# Altium footprint library WR-TBL_Wire Protector.PcbLib: 120 footprints (part 1 of 8)
Each footprint in its own frame and in the unit in brackets; x right, y up, seen from the top. Pads: shape width x height; smd on the part's side, far side on the other; paste and mask are expansions set on the pad; w line width, h text height; cw(c..) or ccw(c..) is an arc to the next point about the centre after c.
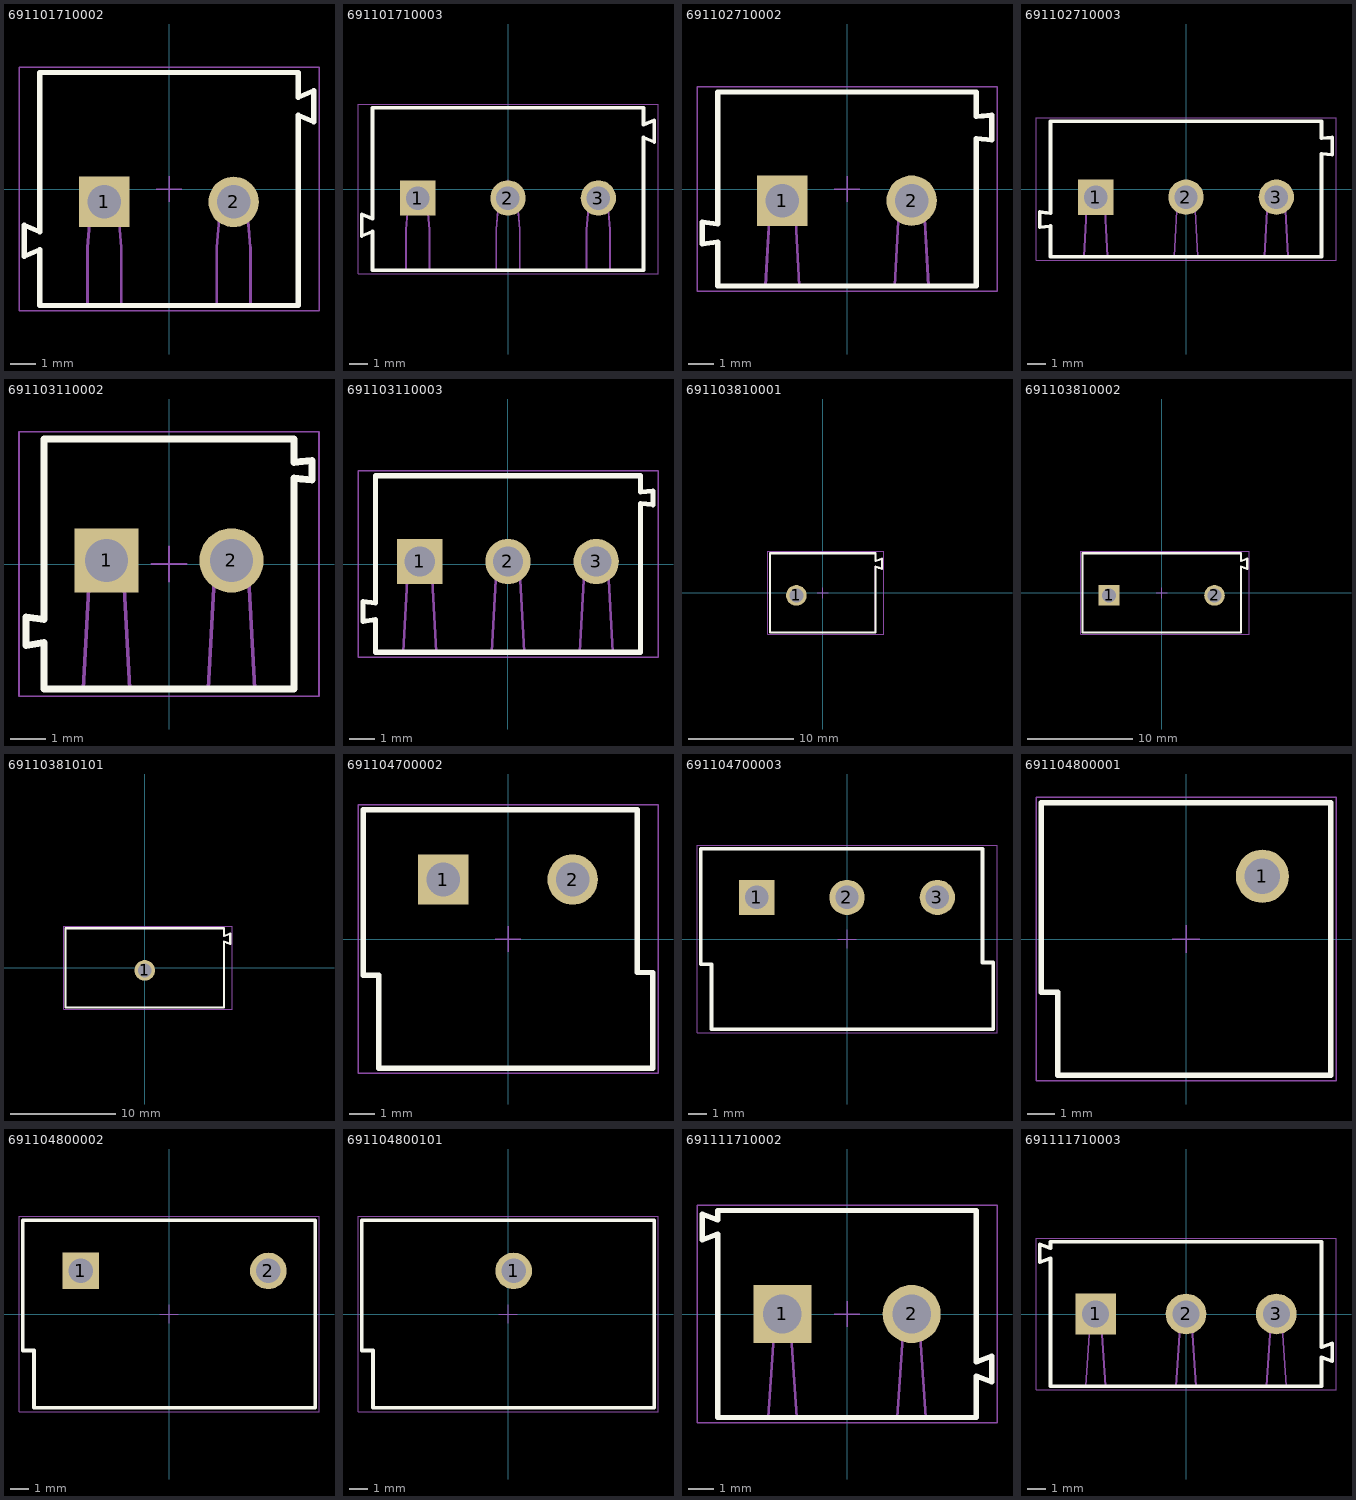
[diagram p0: the footprints below, top view; thin cyan lines are the x and y axes]

## 691101710002 [mm] "5,00mm - modular - blue - Horizontal entry with pressure clamp - 12,6mm height - 02p"
height 12.6
pads (2):
  rect 1.95x1.95 hole 1.3: 1(-2.5,-0.5)
  round 1.95 hole 1.3: 2(2.5,-0.5)
Top Overlay:
  lines w0.2: -5,-2.35 -5.6,-2.6 -5.6,-1.4 -5,-1.65 -5,4.5 5,4.5 5,3.55 5.6,3.8 5.6,2.6 5,2.85 5,-4.5 -5,-4.5 -5,-2.35
Mechanical 13:
  lines w0.1: -5,-2.35 -5.6,-2.6 -5.6,-1.4 -5,-1.65 -5,4.5 5,4.5 5,3.55 5.6,3.8 5.6,2.6 5,2.85 5,-4.5 -5,-4.5 -5,-2.35 ; -3.15,-4.5 -3.15,-2.25 -2.996,-0.457 ; -3,-0.5 cw(c-2.5,-0.5) -2,-0.5 ; -2.004,-0.457 -1.85,-2.25 -1.85,-4.5 ; 1.85,-4.5 1.85,-2.25 2.004,-0.457 ; 2,-0.5 cw(c2.5,-0.5) 3,-0.5 ; 2.996,-0.457 3.15,-2.25 3.15,-4.5
Mechanical 15:
  lines w0.05: -0.5,0 0.5,0 ; 0,-0.5 0,0.5 ; -5.8,-4.7 -5.8,4.7 5.8,4.7 5.8,-4.7 -5.8,-4.7
3D body "691101710002.stp": height 12.65, standoff -3.75, extent -5.6,-4.5 5.6,4.5

## 691101710003 [mm] "5,00mm - modular - blue - Horizontal entry with pressure clamp - 12,6mm height - 03p"
height 12.6
pads (3):
  rect 1.95x1.95 hole 1.3: 1(-5,-0.5)
  round 1.95 hole 1.3: 2(0,-0.5) 3(5,-0.5)
Top Overlay:
  lines w0.2: -7.5,-2.35 -8.1,-2.6 -8.1,-1.4 -7.5,-1.65 -7.5,4.5 7.5,4.5 7.5,3.55 8.1,3.8 8.1,2.6 7.5,2.85 7.5,-4.5 -7.5,-4.5 -7.5,-2.35
Mechanical 13:
  lines w0.1: -7.5,-2.35 -8.1,-2.6 -8.1,-1.4 -7.5,-1.65 -7.5,4.5 7.5,4.5 7.5,3.55 8.1,3.8 8.1,2.6 7.5,2.85 7.5,-4.5 -7.5,-4.5 -7.5,-2.35 ; -5.65,-4.5 -5.65,-2.25 -5.496,-0.457 ; -5.5,-0.5 cw(c-5,-0.5) -4.5,-0.5 ; -4.504,-0.457 -4.35,-2.25 -4.35,-4.5 ; -0.65,-4.5 -0.65,-2.25 -0.496,-0.457 ; -0.5,-0.5 cw(c0,-0.5) 0.5,-0.5 ; 0.496,-0.457 0.65,-2.25 0.65,-4.5 ; 4.35,-4.5 4.35,-2.25 4.503,-0.457 ; 4.5,-0.5 cw(c5,-0.5) 5.5,-0.5 ; 5.496,-0.457 5.65,-2.25 5.65,-4.5
Mechanical 15:
  lines w0.05: -0.5,0 0.5,0 ; 0,-0.5 0,0.5 ; -8.3,-4.7 8.3,-4.7 8.3,4.7 -8.3,4.7 -8.3,-4.7
3D body "691101710003.stp": height 12.65, standoff -3.75, extent -8.1,-4.5 8.1,4.5

## 691102710002 [mm] "5,00mm - modular - blue - Horizontal entry with pressure clamp - 9,9 mm height - 02p"
height 9.9
pads (2):
  rect 1.95x1.95 hole 1.3: 1(-2.5,-0.45)
  round 1.95 hole 1.3: 2(2.5,-0.45)
Top Overlay:
  lines w0.2: -5.6,-2.125 -5,-2.05 -5,-3.75 5,-3.75 5,1.95 5.6,1.9 5.6,2.85 5,2.8 5,3.75 -5,3.75 -5,-1.35 -5.6,-1.275 -5.6,-2.125
Mechanical 13:
  lines w0.1: -3.15,-3.75 -2.955,-0.15 ; -2.95,-0.15 cw(c-2.5,-0.15) -2.05,-0.15 ; -2.045,-0.15 -1.85,-3.75 ; 1.85,-3.75 2.045,-0.15 ; 2.05,-0.15 cw(c2.5,-0.15) 2.95,-0.15 ; 2.955,-0.15 3.15,-3.75 ; -5.6,-2.125 -5.6,-1.275 -5,-1.35 -5,3.75 5,3.75 5,2.8 5.6,2.85 5.6,1.9 5,1.95 5,-3.75 -5,-3.75 -5,-2.05 -5.6,-2.125
Mechanical 15:
  lines w0.05: -0.5,0 0.5,0 ; 0,-0.5 0,0.5 ; -5.8,-3.95 5.8,-3.95 5.8,3.95 -5.8,3.95 -5.8,-3.95
3D body "691102710002.stp": height 9.96, standoff -3.44, extent -5.6,-3.75 5.6,3.75

## 691102710003 [mm] "5,00mm - modular - blue - Horizontal entry with pressure clamp - 9,9 mm height - 03p"
height 9.9
pads (3):
  rect 1.95x1.95 hole 1.3: 1(-5,-0.45)
  round 1.95 hole 1.3: 2(0,-0.45) 3(5,-0.45)
Top Overlay:
  lines w0.2: -8.1,-2.125 -8.1,-1.275 -7.5,-1.35 -7.5,3.75 7.5,3.75 7.5,2.8 8.1,2.85 8.1,1.9 7.5,1.95 7.5,-3.75 -7.5,-3.75 -7.5,-2.05 -8.1,-2.125
Mechanical 13:
  lines w0.1: -5.65,-3.75 -5.455,-0.15 ; -5.45,-0.15 cw(c-5,-0.15) -4.55,-0.15 ; -4.545,-0.15 -4.35,-3.75 ; -0.65,-3.75 -0.455,-0.15 ; -0.45,-0.15 cw(c0,-0.15) 0.45,-0.15 ; 0.455,-0.15 0.65,-3.75 ; 4.35,-3.75 4.545,-0.15 ; 4.55,-0.15 cw(c5,-0.15) 5.45,-0.15 ; 5.455,-0.15 5.65,-3.75 ; -8.1,-2.125 -7.5,-2.05 -7.5,-3.75 7.5,-3.75 7.5,1.95 8.1,1.9 8.1,2.85 7.5,2.8 7.5,3.75 -7.5,3.75 -7.5,-1.35 -8.1,-1.275 -8.1,-2.125
Mechanical 15:
  lines w0.05: -0.5,0 0.5,0 ; 0,-0.5 0,0.5 ; -8.3,-3.95 -8.3,3.95 8.3,3.95 8.3,-3.95 -8.3,-3.95
3D body "691102710003.stp": height 9.96, standoff -3.44, extent -8.1,-3.75 8.1,3.75

## 691103110002 [mm] "3,50mm - modular - blue - Horizontal wire entry - Pressure clamp - 8,4mm height - 02p"
height 8.4
pads (2):
  rect 1.8x1.8 hole 1.2: 1(-1.75,0.1)
  round 1.8 hole 1.2: 2(1.75,0.1)
Top Overlay:
  lines w0.2: -3.5,-1.55 -3.5,3.5 3.5,3.5 3.5,2.85 4,2.899 4,2.35 ; -3.499,-1.55 -4,-1.48 -4,-2.278 -3.5,-2.2 -3.5,-3.5 3.5,-3.5 3.5,2.4 4,2.351
Mechanical 13:
  lines w0.1: -3.5,-1.55 -3.5,3.5 3.5,3.5 3.5,2.85 4,2.899 4,2.35 ; -3.499,-1.55 -4,-1.48 -4,-2.278 -3.5,-2.2 -3.5,-3.5 3.5,-3.5 3.5,2.4 4,2.351 ; -2.4,-3.5 -2.205,0.1 ; -2.2,0.1 cw(c-1.75,0.1) -1.3,0.1 ; -1.295,0.1 -1.1,-3.5 ; 1.1,-3.5 1.295,0.1 ; 1.3,0.1 cw(c1.75,0.1) 2.2,0.1 ; 2.205,0.1 2.4,-3.5
Mechanical 15:
  lines w0.05: -0.5,0 0.5,0 ; 0,-0.5 0,0.5 ; -4.2,-3.7 -4.2,3.7 4.2,3.7 4.2,-3.7 -4.2,-3.7
3D body "691103110002.stp": height 8.45, standoff -3.75, extent -4,-3.5 4,3.5

## 691103110003 [mm] "3,50mm - modular - blue - Horizontal wire entry - Pressure clamp - 8,4mm height - 03p"
height 8.4
pads (3):
  rect 1.8x1.8 hole 1.2: 1(-3.5,0.1)
  round 1.8 hole 1.2: 2(0,0.1) 3(3.5,0.1)
Top Overlay:
  lines w0.2: -5.25,-1.55 -5.25,3.5 5.25,3.5 5.25,2.85 5.75,2.899 5.75,2.35 ; -5.249,-1.55 -5.75,-1.48 -5.75,-2.278 -5.25,-2.2 -5.25,-3.5 5.25,-3.5 5.25,2.4 5.75,2.351
Mechanical 13:
  lines w0.1: -5.25,-1.55 -5.25,3.5 5.25,3.5 5.25,2.85 5.75,2.899 5.75,2.35 ; -5.249,-1.55 -5.75,-1.48 -5.75,-2.278 -5.25,-2.2 -5.25,-3.5 5.25,-3.5 5.25,2.4 5.75,2.351 ; -4.15,-3.5 -3.955,0.1 ; -3.95,0.1 cw(c-3.5,0.1) -3.05,0.1 ; -3.045,0.1 -2.85,-3.5 ; -0.65,-3.5 -0.455,0.1 ; -0.45,0.1 cw(c0,0.1) 0.45,0.1 ; 0.455,0.1 0.65,-3.5 ; 2.85,-3.5 3.045,0.1 ; 3.05,0.1 cw(c3.5,0.1) 3.95,0.1 ; 3.955,0.1 4.15,-3.5
Mechanical 15:
  lines w0.05: -0.5,0 0.5,0 ; -0.35,0 0.35,0 ; 0,-0.5 0,0.5 ; 0,-0.35 0,0.35 ; -5.95,-3.7 -5.95,3.7 5.95,3.7 5.95,-3.7 -5.95,-3.7
3D body "691103110003.stp": height 8.45, standoff -3.75, extent -5.75,-3.5 5.75,3.5

## 691103810001 [mm] "Horizontal Cable Entry with Pressure Clamp, pitch 10mm"
height 10
pads (1):
  round 1.95 hole 1.3: 1(-2.5,-0.25)
Top Overlay:
  lines w0.2: 4.998,-3.748 4.998,2.494 cw(c2.595,-4.291) 5.6,2.25 5.6,3.25 ; 5,-3.75 -5,-3.75 -5,3.75 5,3.75 5,3 ccw(c2.5,9.75) 5.599,3.253
Mechanical 13:
  lines w0.1: 4.998,-3.748 4.998,2.494 cw(c2.595,-4.291) 5.6,2.25 5.6,3.25 ; 5,-3.75 -5,-3.75 -5,3.75 5,3.75 5,3 ccw(c2.5,9.75) 5.599,3.253
Mechanical 15:
  lines w0.05: -0.5,0 0.5,0 ; 0,-0.5 0,0.5 ; -5.2,-3.95 5.8,-3.95 5.8,3.95 -5.2,3.95 -5.2,-3.95
3D body "691103810001.stp": height 10.1, standoff -3.9, extent -5,-3.75 5.6,3.75

## 691103810002 [mm] "Horizontal Cable Entry with Pressure Clamp, pitch 10mm"
height 10
pads (2):
  rect 1.95x1.95 hole 1.3: 1(-5,-0.25)
  round 1.95 hole 1.3: 2(5,-0.25)
Top Overlay:
  lines w0.2: 7.5,3 7.5,3.75 -7.5,3.75 -7.5,-3.75 7.5,-3.75 7.5,2.494 cw(c5.097,-4.291) 8.102,2.25 8.102,3.25 ; 7.502,3 ccw(c5.002,9.75) 8.101,3.253
Mechanical 13:
  lines w0.1: 7.5,3 7.5,3.75 -7.5,3.75 -7.5,-3.75 7.5,-3.75 7.5,2.494 cw(c5.097,-4.291) 8.102,2.25 8.102,3.25 ; 7.502,3 ccw(c5.002,9.75) 8.101,3.253
Mechanical 15:
  lines w0.05: -0.5,0 0.5,0 ; 0,-0.5 0,0.5 ; -7.7,-3.95 8.3,-3.95 8.3,3.95 -7.7,3.95 -7.7,-3.95
3D body "691103810002.stp": height 10.1, standoff -3.9, extent -7.5,-3.75 8.1,3.75

## 691103810101 [mm] "Horizontal Cable Entry with Pressure Clamp, pitch 10mm"
height 10
pads (1):
  round 1.95 hole 1.3: 1(0,-0.25)
Top Overlay:
  lines w0.2: 7.5,3 7.5,3.75 -7.5,3.75 -7.5,-3.75 7.5,-3.75 7.5,2.494 cw(c5.097,-4.291) 8.102,2.25 8.102,3.25 ; 7.502,3 ccw(c5.002,9.75) 8.101,3.253
Mechanical 13:
  lines w0.1: 7.5,3 7.5,3.75 -7.5,3.75 -7.5,-3.75 7.5,-3.75 7.5,2.494 cw(c5.097,-4.291) 8.102,2.25 8.102,3.25 ; 7.502,3 ccw(c5.002,9.75) 8.101,3.253
Mechanical 15:
  lines w0.05: -0.5,0 0.5,0 ; 0,-0.5 0,0.5 ; -7.7,-3.95 -7.7,3.95 8.3,3.95 8.3,-3.95 -7.7,-3.95
3D body "691103810101.stp": height 10.1, standoff -3.9, extent -7.5,-3.75 8.1,3.75

## 691104700002 [mm] ",00mm - modular - blue - Vertical wire entry - Pressure clamp - 02p"
height 10
pads (2):
  rect 1.95x1.95 hole 1.3: 1(-2.5,2.3)
  round 1.95 hole 1.3: 2(2.5,2.3)
Top Overlay:
  lines w0.2: -5.6,-1.4 -5,-1.4 -5,-5 5.6,-5 5.6,-1.3 5,-1.3 5,5 -5.6,5 -5.6,-1.4
Mechanical 13:
  lines w0.1: -5.6,-1.4 -5.6,5 5,5 5,-1.3 5.6,-1.3 5.6,-5 -5,-5 -5,-1.4 -5.6,-1.4
Mechanical 15:
  lines w0.05: -0.5,0 0.5,0 ; 0,-0.5 0,0.5 ; -5.8,-5.2 -5.8,5.2 5.8,5.2 5.8,-5.2 -5.8,-5.2
3D body "691104700002.stp": height 7.55, standoff -3.75, extent -5.6,-5 5.6,5

## 691104700003 [mm] ",00mm - modular - blue - Vertical wire entry - Pressure clamp - 03p"
height 10
pads (3):
  rect 1.95x1.95 hole 1.3: 1(-5,2.3)
  round 1.95 hole 1.3: 2(0,2.3) 3(5,2.3)
Top Overlay:
  lines w0.2: -8.1,-1.4 -7.5,-1.4 -7.5,-5 8.1,-5 8.1,-1.3 7.5,-1.3 7.5,5 -8.1,5 -8.1,-1.4
Mechanical 13:
  lines w0.1: -8.1,-1.4 -8.1,5 7.5,5 7.5,-1.3 8.1,-1.3 8.1,-5 -7.5,-5 -7.5,-1.4 -8.1,-1.4
Mechanical 15:
  lines w0.05: -0.5,0 0.5,0 ; 0,-0.5 0,0.5 ; -8.3,-5.2 8.3,-5.2 8.3,5.2 -8.3,5.2 -8.3,-5.2
3D body "691104700003.stp": height 7.55, standoff -3.75, extent -8.1,-5 8.1,5

## 691104800001 [mm] "Vertical Cable Entry with Pressure Clamp, pitch 10mm"
height 7.5
pads (1):
  round 1.95 hole 1.3: 1(2.8,2.3)
Top Overlay:
  lines w0.2: -5.3,-1.95 -4.7,-1.95 -4.7,-5 5.3,-5 5.3,5 -5.3,5 -5.3,-1.95
Mechanical 13:
  lines w0.1: -5.3,-1.95 -5.3,5 5.3,5 5.3,-5 -4.7,-5 -4.7,-1.95 -5.3,-1.95
Mechanical 15:
  lines w0.05: -0.5,0 0.5,0 ; 0,-0.5 0,0.5 ; -5.5,-5.2 5.5,-5.2 5.5,5.2 -5.5,5.2 -5.5,-5.2
3D body "691104800001.stp": height 7.55, standoff -3.65, extent -5.3,-5 5.3,5

## 691104800002 [mm] "Vertical Cable Entry with Pressure Clamp, pitch 10mm"
height 7.5
pads (2):
  rect 1.95x1.95 hole 1.3: 1(-4.7,2.3)
  round 1.95 hole 1.3: 2(5.3,2.3)
Top Overlay:
  lines w0.2: -7.8,-1.95 -7.8,5 7.8,5 7.8,-5 -7.2,-5 -7.2,-1.95 -7.8,-1.95
Mechanical 13:
  lines w0.1: -7.8,-1.95 -7.2,-1.95 -7.2,-5 7.8,-5 7.8,5 -7.8,5 -7.8,-1.95
Mechanical 15:
  lines w0.05: -0.5,0 0.5,0 ; 0,-0.5 0,0.5 ; -8,-5.2 -8,5.2 8,5.2 8,-5.2 -8,-5.2
3D body "691104800002.stp": height 7.55, standoff -3.65, extent -7.8,-5 7.8,5

## 691104800101 [mm] "Vertical Cable Entry with Pressure Clamp, pitch 10mm"
height 7.5
pads (1):
  round 1.95 hole 1.3: 1(0.3,2.3)
Top Overlay:
  lines w0.2: -7.8,-1.95 -7.8,5 7.8,5 7.8,-5 -7.2,-5 -7.2,-1.95 -7.8,-1.95
Mechanical 13:
  lines w0.1: -7.8,-1.95 -7.2,-1.95 -7.2,-5 7.8,-5 7.8,5 -7.8,5 -7.8,-1.95
Mechanical 15:
  lines w0.05: -0.5,0 0.5,0 ; 0,-0.5 0,0.5 ; -8,-5.2 -8,5.2 8,5.2 8,-5.2 -8,-5.2
3D body "691104800101.stp": height 7.55, standoff -3.65, extent -7.8,-5 7.8,5

## 691111710002 [mm] "5,00mm - modular - green - Horizontal entry with pressure clamp - 10,0mm height - 02p"
height 10
pads (2):
  rect 2.25x2.25 hole 1.5: 1(-2.5,0)
  round 2.25 hole 1.5: 2(2.5,0)
Top Overlay:
  lines w0.2: -5.6,2.865 -5,3.09 -5,-4 5,-4 5,-2.4 5.6,-2.625 5.6,-1.625 5,-1.85 5,4 -5,4 -5,3.64 -5.6,3.865 -5.6,2.865
Mechanical 13:
  lines w0.1: -3.05,-4 -2.798,-0.309 ; -2.8,-0.3 -2.8,0.7 -2.2,0.7 -2.2,-0.3 ; -2.202,-0.309 -1.95,-4 ; 1.95,-4 2.202,-0.309 ; 2.2,-0.3 2.2,0.7 2.8,0.7 2.8,-0.3 ; 2.798,-0.309 3.05,-4 ; -5.6,2.865 -5.6,3.865 -5,3.64 -5,4 5,4 5,-1.85 5.6,-1.625 5.6,-2.625 5,-2.4 5,-4 -5,-4 -5,3.09 -5.6,2.865
Mechanical 15:
  lines w0.05: -0.5,0 0.5,0 ; 0,-0.5 0,0.5 ; -5.8,-4.2 -5.8,4.2 5.8,4.2 5.8,-4.2 -5.8,-4.2
3D body "691111710002.stp": height 11.05, standoff -3.95, extent -5.6,-4 5.6,4

## 691111710003 [mm] "5,00mm - modular - green - Horizontal entry with pressure clamp - 10,0mm height - 03p"
height 10
pads (3):
  rect 2.25x2.25 hole 1.5: 1(-5,0)
  round 2.25 hole 1.5: 2(0,0) 3(5,0)
Top Overlay:
  lines w0.2: -8.1,2.865 -7.5,3.09 -7.5,-4 7.5,-4 7.5,-2.4 8.1,-2.625 8.1,-1.625 7.5,-1.85 7.5,4 -7.5,4 -7.5,3.64 -8.1,3.865 -8.1,2.865
Mechanical 13:
  lines w0.1: -5.55,-4 -5.298,-0.309 ; -5.3,-0.3 -5.3,0.7 -4.7,0.7 -4.7,-0.3 ; -4.702,-0.309 -4.45,-4 ; -0.55,-4 -0.298,-0.309 ; -0.3,-0.3 -0.3,0.7 0.3,0.7 0.3,-0.3 ; 0.298,-0.309 0.55,-4 ; 4.45,-4 4.702,-0.309 ; 4.7,-0.3 4.7,0.7 5.3,0.7 5.3,-0.3 ; 5.298,-0.309 5.55,-4 ; -8.1,2.865 -8.1,3.865 -7.5,3.64 -7.5,4 7.5,4 7.5,-1.85 8.1,-1.625 8.1,-2.625 7.5,-2.4 7.5,-4 -7.5,-4 -7.5,3.09 -8.1,2.865
Mechanical 15:
  lines w0.05: -0.5,0 0.5,0 ; 0,-0.5 0,0.5 ; -8.3,-4.2 -8.3,4.2 8.3,4.2 8.3,-4.2 -8.3,-4.2
3D body "691111710003.stp": height 11.05, standoff -3.95, extent -8.1,-4 8.1,4